# Altium integrated library Samtec 2,54 mm Pitch Socket Strips.IntLib: 489 symbols (part 3 of 4) (continued)
## SSQ-126-22-T-D (continued)

## SSW-102-02-F-S
designator J?
SQ Post Socket, Through-hole, Vertical, -55 to 125 degC, 2.54 mm Pitch, 2-Pin, Female, RoHS; Manufacturer: Samtec; PartNumber: SSW-102-02-F-S; Pitch: 2.54 mm; DatasheetVersion: F-214; PackageVersion: CA, 6/1987; PackageReference: SSW-102-02-X-S; PackageDescription: Assembly, Socket Strip .016 X .031 Tail; Orientation: Vertical; RoHS: True; Temperature Range: -55 to 125 degC; Mounting Technology: Through-hole; ComponentLink1Description: Manufacturer URL; ComponentLink1URL: http://www.samtec.com; ComponentLink2Description: Datasheet; ComponentLink2URL: http://www.samtec.com/documents/webfiles/pdf/SSW_TH.PDF; ComponentLink3Description: Package Specification; ComponentLink3URL: http://www.samtec.com/documents/webfiles/cpdf/SSW-1XX-XX-XXX-X-XX-XXX-XX-MKT.pdf
footprint SMTC-SSW-102-02-X-S (SQ Post Socket, 1x2 Pins, Vertical, 2.54mm Pitch, Female)
pins: 1, 2

## SSW-102-02-F-S-RA
designator J?
SQ Post Socket, Through-hole, Right Angle, -55 to 125 degC, 2.54 mm Pitch, 2-Pin, Female, RoHS; Manufacturer: Samtec; PartNumber: SSW-102-02-F-S-RA; Pitch: 2.54 mm; DatasheetVersion: F-214; PackageVersion: CA, 6/1987; PackageReference: SSW-102-02-X-S-RA; PackageDescription: Assembly, Socket Strip .016 X .031 Tail; Orientation: Right Angle; RoHS: True; Temperature Range: -55 to 125 degC; Mounting Technology: Through-hole; ComponentLink1Description: Manufacturer URL; ComponentLink1URL: http://www.samtec.com; ComponentLink2Description: Datasheet; ComponentLink2URL: http://www.samtec.com/documents/webfiles/pdf/SSW_TH.PDF; ComponentLink3Description: Package Specification; ComponentLink3URL: http://www.samtec.com/documents/webfiles/cpdf/SSW-1XX-XX-XXX-X-XX-XXX-XX-MKT.pdf
footprint SMTC-SSW-102-02-X-S-RA (SQ Post Socket, 1x2 Pins, Right Angle, 2.54mm Pitch, Female)
pins: 1, 2

## SSW-102-02-G-S
designator J?
SQ Post Socket, Through-hole, Vertical, -55 to 125 degC, 2.54 mm Pitch, 2-Pin, Female, RoHS; Manufacturer: Samtec; PartNumber: SSW-102-02-G-S; Pitch: 2.54 mm; DatasheetVersion: F-214; PackageVersion: CA, 6/1987; PackageReference: SSW-102-02-X-S; PackageDescription: Assembly, Socket Strip .016 X .031 Tail; Supplier 1: Digi-Key; Supplier Part Number 1: SAM1216-02-ND; Supplier 2: Farnell; Supplier Part Number 2: 1668334; Supplier 3: Newark; Supplier Part Number 3: 15P2870; Supplier 4: Newark; Supplier Part Number 4: 11P9347; Orientation: Vertical; RoHS: True; Temperature Range: -55 to 125 degC; Mounting Technology: Through-hole; ComponentLink1Description: Manufacturer URL; ComponentLink1URL: http://www.samtec.com; ComponentLink2Description: Datasheet; ComponentLink2URL: http://www.samtec.com/documents/webfiles/pdf/SSW_TH.PDF; ComponentLink3Description: Package Specification; ComponentLink3URL: http://www.samtec.com/documents/webfiles/cpdf/SSW-1XX-XX-XXX-X-XX-XXX-XX-MKT.pdf
footprint SMTC-SSW-102-02-X-S (SQ Post Socket, 1x2 Pins, Vertical, 2.54mm Pitch, Female)
pins: 1, 2

## SSW-102-02-G-S-RA
designator J?
SQ Post Socket, Through-hole, Right Angle, -55 to 125 degC, 2.54 mm Pitch, 2-Pin, Female, RoHS; Manufacturer: Samtec; PartNumber: SSW-102-02-G-S-RA; Pitch: 2.54 mm; DatasheetVersion: F-214; PackageVersion: CA, 6/1987; PackageReference: SSW-102-02-X-S-RA; PackageDescription: Assembly, Socket Strip .016 X .031 Tail; Supplier 1: Digi-Key; Supplier Part Number 1: SAM1225-02-ND; Supplier 2: Farnell; Supplier Part Number 2: 1668335; Supplier 3: Newark; Supplier Part Number 3: 15P2871; Supplier 4: Newark; Supplier Part Number 4: 11P9348; Orientation: Right Angle; RoHS: True; Temperature Range: -55 to 125 degC; Mounting Technology: Through-hole; ComponentLink1Description: Manufacturer URL; ComponentLink1URL: http://www.samtec.com; ComponentLink2Description: Datasheet; ComponentLink2URL: http://www.samtec.com/documents/webfiles/pdf/SSW_TH.PDF; ComponentLink3Description: Package Specification; ComponentLink3URL: http://www.samtec.com/documents/webfiles/cpdf/SSW-1XX-XX-XXX-X-XX-XXX-XX-MKT.pdf
footprint SMTC-SSW-102-02-X-S-RA (SQ Post Socket, 1x2 Pins, Right Angle, 2.54mm Pitch, Female)
pins: 1, 2

## SSW-102-02-L-S
designator J?
SQ Post Socket, Through-hole, Vertical, -55 to 125 degC, 2.54 mm Pitch, 2-Pin, Female, RoHS; Manufacturer: Samtec; PartNumber: SSW-102-02-L-S; Pitch: 2.54 mm; DatasheetVersion: F-214; PackageVersion: CA, 6/1987; PackageReference: SSW-102-02-X-S; PackageDescription: Assembly, Socket Strip .016 X .031 Tail; Orientation: Vertical; RoHS: True; Temperature Range: -55 to 125 degC; Mounting Technology: Through-hole; ComponentLink1Description: Manufacturer URL; ComponentLink1URL: http://www.samtec.com; ComponentLink2Description: Datasheet; ComponentLink2URL: http://www.samtec.com/documents/webfiles/pdf/SSW_TH.PDF; ComponentLink3Description: Package Specification; ComponentLink3URL: http://www.samtec.com/documents/webfiles/cpdf/SSW-1XX-XX-XXX-X-XX-XXX-XX-MKT.pdf
footprint SMTC-SSW-102-02-X-S (SQ Post Socket, 1x2 Pins, Vertical, 2.54mm Pitch, Female)
pins: 1, 2

## SSW-102-02-L-S-RA
designator J?
SQ Post Socket, Through-hole, Right Angle, -55 to 125 degC, 2.54 mm Pitch, 2-Pin, Female, RoHS; Manufacturer: Samtec; PartNumber: SSW-102-02-L-S-RA; Pitch: 2.54 mm; DatasheetVersion: F-214; PackageVersion: CA, 6/1987; PackageReference: SSW-102-02-X-S-RA; PackageDescription: Assembly, Socket Strip .016 X .031 Tail; Orientation: Right Angle; RoHS: True; Temperature Range: -55 to 125 degC; Mounting Technology: Through-hole; ComponentLink1Description: Manufacturer URL; ComponentLink1URL: http://www.samtec.com; ComponentLink2Description: Datasheet; ComponentLink2URL: http://www.samtec.com/documents/webfiles/pdf/SSW_TH.PDF; ComponentLink3Description: Package Specification; ComponentLink3URL: http://www.samtec.com/documents/webfiles/cpdf/SSW-1XX-XX-XXX-X-XX-XXX-XX-MKT.pdf
footprint SMTC-SSW-102-02-X-S-RA (SQ Post Socket, 1x2 Pins, Right Angle, 2.54mm Pitch, Female)
pins: 1, 2

## SSW-102-02-T-S
designator J?
SQ Post Socket, Through-hole, Vertical, -55 to 105 degC, 2.54 mm Pitch, 2-Pin, Female, RoHS; Manufacturer: Samtec; PartNumber: SSW-102-02-T-S; Pitch: 2.54 mm; DatasheetVersion: F-214; PackageVersion: CA, 6/1987; PackageReference: SSW-102-02-X-S; PackageDescription: Assembly, Socket Strip .016 X .031 Tail; Supplier 1: Digi-Key; Supplier Part Number 1: SAM1222-02-ND; Orientation: Vertical; RoHS: True; Temperature Range: -55 to 105 degC; Mounting Technology: Through-hole; ComponentLink1Description: Manufacturer URL; ComponentLink1URL: http://www.samtec.com; ComponentLink2Description: Datasheet; ComponentLink2URL: http://www.samtec.com/documents/webfiles/pdf/SSW_TH.PDF; ComponentLink3Description: Package Specification; ComponentLink3URL: http://www.samtec.com/documents/webfiles/cpdf/SSW-1XX-XX-XXX-X-XX-XXX-XX-MKT.pdf
footprint SMTC-SSW-102-02-X-S (SQ Post Socket, 1x2 Pins, Vertical, 2.54mm Pitch, Female)
pins: 1, 2

## SSW-102-02-T-S-RA
designator J?
SQ Post Socket, Through-hole, Right Angle, -55 to 105 degC, 2.54 mm Pitch, 2-Pin, Female, RoHS; Manufacturer: Samtec; PartNumber: SSW-102-02-T-S-RA; Pitch: 2.54 mm; DatasheetVersion: F-214; PackageVersion: CA, 6/1987; PackageReference: SSW-102-02-X-S-RA; PackageDescription: Assembly, Socket Strip .016 X .031 Tail; Supplier 1: Newark; Supplier Part Number 1: 82P1723; Orientation: Right Angle; RoHS: True; Temperature Range: -55 to 105 degC; Mounting Technology: Through-hole; ComponentLink1Description: Manufacturer URL; ComponentLink1URL: http://www.samtec.com; ComponentLink2Description: Datasheet; ComponentLink2URL: http://www.samtec.com/documents/webfiles/pdf/SSW_TH.PDF; ComponentLink3Description: Package Specification; ComponentLink3URL: http://www.samtec.com/documents/webfiles/cpdf/SSW-1XX-XX-XXX-X-XX-XXX-XX-MKT.pdf
footprint SMTC-SSW-102-02-X-S-RA (SQ Post Socket, 1x2 Pins, Right Angle, 2.54mm Pitch, Female)
pins: 1, 2

## SSW-103-01-F-D
designator J?
SQ Post Socket, Through-hole, Vertical, -55 to 125 degC, 2.54 mm Pitch, 6-Pin, Female, RoHS; Manufacturer: Samtec; PartNumber: SSW-103-01-F-D; Pitch: 2.54 mm; DatasheetVersion: F-214; PackageVersion: CA, 6/1987; PackageReference: SSW-103-01-X-D; PackageDescription: Assembly, Socket Strip .016 X .031 Tail; Supplier 1: Newark; Supplier Part Number 1: 82P1975; Orientation: Vertical; RoHS: True; Temperature Range: -55 to 125 degC; Mounting Technology: Through-hole; ComponentLink1Description: Manufacturer URL; ComponentLink1URL: http://www.samtec.com; ComponentLink2Description: Datasheet; ComponentLink2URL: http://www.samtec.com/documents/webfiles/pdf/SSW_TH.PDF; ComponentLink3Description: Package Specification; ComponentLink3URL: http://www.samtec.com/documents/webfiles/cpdf/SSW-1XX-XX-XXX-X-XX-XXX-XX-MKT.pdf
footprint SMTC-SSW-103-01-X-D (SQ Post Socket, 2x3 Pins, Vertical, 2.54mm Pitch, Female)
pins: 1, 2, 3, 4, 5, 6

## SSW-103-01-G-D
designator J?
SQ Post Socket, Through-hole, Vertical, -55 to 125 degC, 2.54 mm Pitch, 6-Pin, Female, RoHS; Manufacturer: Samtec; PartNumber: SSW-103-01-G-D; Pitch: 2.54 mm; DatasheetVersion: F-214; PackageVersion: CA, 6/1987; PackageReference: SSW-103-01-X-D; PackageDescription: Assembly, Socket Strip .016 X .031 Tail; Supplier 1: Digi-Key; Supplier Part Number 1: SAM1208-03-ND; Supplier 2: Farnell; Supplier Part Number 2: 1668336; Supplier 3: Newark; Supplier Part Number 3: 15P2872; Supplier 4: Newark; Supplier Part Number 4: 11P9356; Orientation: Vertical; RoHS: True; Temperature Range: -55 to 125 degC; Mounting Technology: Through-hole; ComponentLink1Description: Manufacturer URL; ComponentLink1URL: http://www.samtec.com; ComponentLink2Description: Datasheet; ComponentLink2URL: http://www.samtec.com/documents/webfiles/pdf/SSW_TH.PDF; ComponentLink3Description: Package Specification; ComponentLink3URL: http://www.samtec.com/documents/webfiles/cpdf/SSW-1XX-XX-XXX-X-XX-XXX-XX-MKT.pdf
footprint SMTC-SSW-103-01-X-D (SQ Post Socket, 2x3 Pins, Vertical, 2.54mm Pitch, Female)
pins: 1, 2, 3, 4, 5, 6

## SSW-103-01-L-D
designator J?
SQ Post Socket, Through-hole, Vertical, -55 to 125 degC, 2.54 mm Pitch, 6-Pin, Female, RoHS; Manufacturer: Samtec; PartNumber: SSW-103-01-L-D; Pitch: 2.54 mm; DatasheetVersion: F-214; PackageVersion: CA, 6/1987; PackageReference: SSW-103-01-X-D; PackageDescription: Assembly, Socket Strip .016 X .031 Tail; Supplier 1: Newark; Supplier Part Number 1: 87T7165; Orientation: Vertical; RoHS: True; Temperature Range: -55 to 125 degC; Mounting Technology: Through-hole; ComponentLink1Description: Manufacturer URL; ComponentLink1URL: http://www.samtec.com; ComponentLink2Description: Datasheet; ComponentLink2URL: http://www.samtec.com/documents/webfiles/pdf/SSW_TH.PDF; ComponentLink3Description: Package Specification; ComponentLink3URL: http://www.samtec.com/documents/webfiles/cpdf/SSW-1XX-XX-XXX-X-XX-XXX-XX-MKT.pdf
footprint SMTC-SSW-103-01-X-D (SQ Post Socket, 2x3 Pins, Vertical, 2.54mm Pitch, Female)
pins: 1, 2, 3, 4, 5, 6

## SSW-103-01-T-D
designator J?
SQ Post Socket, Through-hole, Vertical, -55 to 105 degC, 2.54 mm Pitch, 6-Pin, Female, RoHS; Manufacturer: Samtec; PartNumber: SSW-103-01-T-D; Pitch: 2.54 mm; DatasheetVersion: F-214; PackageVersion: CA, 6/1987; PackageReference: SSW-103-01-X-D; PackageDescription: Assembly, Socket Strip .016 X .031 Tail; Supplier 1: Digi-Key; Supplier Part Number 1: SAM1212-03-ND; Supplier 2: Newark; Supplier Part Number 2: 11P9359; Orientation: Vertical; RoHS: True; Temperature Range: -55 to 105 degC; Mounting Technology: Through-hole; ComponentLink1Description: Manufacturer URL; ComponentLink1URL: http://www.samtec.com; ComponentLink2Description: Datasheet; ComponentLink2URL: http://www.samtec.com/documents/webfiles/pdf/SSW_TH.PDF; ComponentLink3Description: Package Specification; ComponentLink3URL: http://www.samtec.com/documents/webfiles/cpdf/SSW-1XX-XX-XXX-X-XX-XXX-XX-MKT.pdf
footprint SMTC-SSW-103-01-X-D (SQ Post Socket, 2x3 Pins, Vertical, 2.54mm Pitch, Female)
pins: 1, 2, 3, 4, 5, 6

## SSW-103-22-F-S-VS
designator J?
SQ Post Socket, Surface Mount, Vertical, -55 to 125 degC, 2.54 mm Pitch, 3-Pin, Female, RoHS; Manufacturer: Samtec; PartNumber: SSW-103-22-F-S-VS; Pitch: 2.54 mm; DatasheetVersion: F-214; PackageVersion: AS, 1/1997; PackageReference: SSW-103-22-X-S-VS; PackageDescription: .100 [2.54] Surface Mount Assembly; Supplier 1: Newark; Supplier Part Number 1: 82P2254; Orientation: Vertical; RoHS: True; Temperature Range: -55 to 125 degC; Mounting Technology: Surface Mount; ComponentLink1Description: Manufacturer URL; ComponentLink1URL: http://www.samtec.com; ComponentLink2Description: Datasheet; ComponentLink2URL: http://www.samtec.com/documents/webfiles/pdf/SSW_SM.PDF; ComponentLink3Description: Package Specification; ComponentLink3URL: http://www.samtec.com/documents/webfiles/cpdf/SSW-1XX-22-XXX-X-XX-XX-X-XX-MKT.pdf
footprint SMTC-SSW-103-22-X-S-VS (SQ Post Socket, 3 Pins, Vertical, 2.54mm Pitch, Female)
pins: 1, 2, 3

## SSW-103-22-G-S-VS
designator J?
SQ Post Socket, Surface Mount, Vertical, -55 to 125 degC, 2.54 mm Pitch, 3-Pin, Female, RoHS; Manufacturer: Samtec; PartNumber: SSW-103-22-G-S-VS; Pitch: 2.54 mm; DatasheetVersion: F-214; PackageVersion: AS, 1/1997; PackageReference: SSW-103-22-X-S-VS; PackageDescription: .100 [2.54] Surface Mount Assembly; Orientation: Vertical; RoHS: True; Temperature Range: -55 to 125 degC; Mounting Technology: Surface Mount; ComponentLink1Description: Manufacturer URL; ComponentLink1URL: http://www.samtec.com; ComponentLink2Description: Datasheet; ComponentLink2URL: http://www.samtec.com/documents/webfiles/pdf/SSW_SM.PDF; ComponentLink3Description: Package Specification; ComponentLink3URL: http://www.samtec.com/documents/webfiles/cpdf/SSW-1XX-22-XXX-X-XX-XX-X-XX-MKT.pdf
footprint SMTC-SSW-103-22-X-S-VS (SQ Post Socket, 3 Pins, Vertical, 2.54mm Pitch, Female)
pins: 1, 2, 3

## SSW-103-22-L-S-VS
designator J?
SQ Post Socket, Surface Mount, Vertical, -55 to 125 degC, 2.54 mm Pitch, 3-Pin, Female, RoHS; Manufacturer: Samtec; PartNumber: SSW-103-22-L-S-VS; Pitch: 2.54 mm; DatasheetVersion: F-214; PackageVersion: AS, 1/1997; PackageReference: SSW-103-22-X-S-VS; PackageDescription: .100 [2.54] Surface Mount Assembly; Orientation: Vertical; RoHS: True; Temperature Range: -55 to 125 degC; Mounting Technology: Surface Mount; ComponentLink1Description: Manufacturer URL; ComponentLink1URL: http://www.samtec.com; ComponentLink2Description: Datasheet; ComponentLink2URL: http://www.samtec.com/documents/webfiles/pdf/SSW_SM.PDF; ComponentLink3Description: Package Specification; ComponentLink3URL: http://www.samtec.com/documents/webfiles/cpdf/SSW-1XX-22-XXX-X-XX-XX-X-XX-MKT.pdf
footprint SMTC-SSW-103-22-X-S-VS (SQ Post Socket, 3 Pins, Vertical, 2.54mm Pitch, Female)
pins: 1, 2, 3

## SSW-104-01-F-D
designator J?
SQ Post Socket, Through-hole, Vertical, -55 to 125 degC, 2.54mm Pitch, 8-Pin, Female, RoHS; Manufacturer: Samtec; PartNumber: SSW-104-01-F-D; DatasheetVersion: F-214; PackageVersion: CA, 6/1987; PackageReference: SSW-104-01-X-D; PackageDescription: Assembly, Socket Strip .016 X .031 Tail; Orientation: Vertical; Pitch: 2.54 mm; RoHS: True; Temperature Range: -55 to 125 degC; Mounting Technology: Through-hole; ComponentLink1Description: Manufacturer URL; ComponentLink1URL: http://www.samtec.com; ComponentLink2Description: Datasheet; ComponentLink2URL: http://www.samtec.com/documents/webfiles/pdf/SSW_TH.PDF; ComponentLink3Description: Package Specification; ComponentLink3URL: http://www.samtec.com/documents/webfiles/cpdf/SSW-1XX-XX-XXX-X-XX-XXX-XX-MKT.pdf
footprint SMTC-SSW-104-01-X-D (SQ Post Socket, 2x4 Pins, Vertical, 2.54mm Pitch, Female)
pins: 1, 2, 3, 4, 5, 6, 7, 8

## SSW-104-01-G-D
designator J?
SQ Post Socket, Through-hole, Vertical, -55 to 125 degC, 2.54mm Pitch, 8-Pin, Female, RoHS; Manufacturer: Samtec; PartNumber: SSW-104-01-G-D; DatasheetVersion: F-214; PackageVersion: CA, 6/1987; PackageReference: SSW-104-01-X-D; PackageDescription: Assembly, Socket Strip .016 X .031 Tail; Supplier 1: Digi-Key; Supplier Part Number 1: SAM1208-04-ND; Supplier 2: Farnell; Supplier Part Number 2: 1668340; Supplier 3: Newark; Supplier Part Number 3: 11P9372; Orientation: Vertical; Pitch: 2.54 mm; RoHS: True; Temperature Range: -55 to 125 degC; Mounting Technology: Through-hole; ComponentLink1Description: Manufacturer URL; ComponentLink1URL: http://www.samtec.com; ComponentLink2Description: Datasheet; ComponentLink2URL: http://www.samtec.com/documents/webfiles/pdf/SSW_TH.PDF; ComponentLink3Description: Package Specification; ComponentLink3URL: http://www.samtec.com/documents/webfiles/cpdf/SSW-1XX-XX-XXX-X-XX-XXX-XX-MKT.pdf
footprint SMTC-SSW-104-01-X-D (SQ Post Socket, 2x4 Pins, Vertical, 2.54mm Pitch, Female)
pins: 1, 2, 3, 4, 5, 6, 7, 8

## SSW-104-01-L-D
designator J?
SQ Post Socket, Through-hole, Vertical, -55 to 125 degC, 2.54mm Pitch, 8-Pin, Female, RoHS; Manufacturer: Samtec; PartNumber: SSW-104-01-L-D; DatasheetVersion: F-214; PackageVersion: CA, 6/1987; PackageReference: SSW-104-01-X-D; PackageDescription: Assembly, Socket Strip .016 X .031 Tail; Orientation: Vertical; Pitch: 2.54 mm; RoHS: True; Temperature Range: -55 to 125 degC; Mounting Technology: Through-hole; ComponentLink1Description: Manufacturer URL; ComponentLink1URL: http://www.samtec.com; ComponentLink2Description: Datasheet; ComponentLink2URL: http://www.samtec.com/documents/webfiles/pdf/SSW_TH.PDF; ComponentLink3Description: Package Specification; ComponentLink3URL: http://www.samtec.com/documents/webfiles/cpdf/SSW-1XX-XX-XXX-X-XX-XXX-XX-MKT.pdf
footprint SMTC-SSW-104-01-X-D (SQ Post Socket, 2x4 Pins, Vertical, 2.54mm Pitch, Female)
pins: 1, 2, 3, 4, 5, 6, 7, 8

## SSW-104-01-T-D
designator J?
SQ Post Socket, Through-hole, Vertical, -55 to 105 degC, 2.54mm Pitch, 8-Pin, Female, RoHS; Manufacturer: Samtec; PartNumber: SSW-104-01-T-D; DatasheetVersion: F-214; PackageVersion: CA, 6/1987; PackageReference: SSW-104-01-X-D; PackageDescription: Assembly, Socket Strip .016 X .031 Tail; Supplier 1: Digi-Key; Supplier Part Number 1: SAM1212-04-ND; Supplier 2: Newark; Supplier Part Number 2: 11P9376; Orientation: Vertical; Pitch: 2.54 mm; RoHS: True; Temperature Range: -55 to 105 degC; Mounting Technology: Through-hole; ComponentLink1Description: Manufacturer URL; ComponentLink1URL: http://www.samtec.com; ComponentLink2Description: Datasheet; ComponentLink2URL: http://www.samtec.com/documents/webfiles/pdf/SSW_TH.PDF; ComponentLink3Description: Package Specification; ComponentLink3URL: http://www.samtec.com/documents/webfiles/cpdf/SSW-1XX-XX-XXX-X-XX-XXX-XX-MKT.pdf
footprint SMTC-SSW-104-01-X-D (SQ Post Socket, 2x4 Pins, Vertical, 2.54mm Pitch, Female)
pins: 1, 2, 3, 4, 5, 6, 7, 8

## SSW-104-02-F-D
designator J?
SQ Post Socket, Through-hole, Vertical, -55 to 125 degC, 2.54mm Pitch, 8-Pin, Female, RoHS; Manufacturer: Samtec; PartNumber: SSW-104-02-F-D; DatasheetVersion: F-214; PackageVersion: CA, 6/1987; PackageReference: SSW-104-02-X-D; PackageDescription: Assembly, Socket Strip .016 X .031 Tail; Orientation: Vertical; Pitch: 2.54 mm; RoHS: True; Temperature Range: -55 to 125 degC; Mounting Technology: Through-hole; ComponentLink1Description: Manufacturer URL; ComponentLink1URL: http://www.samtec.com; ComponentLink2Description: Datasheet; ComponentLink2URL: http://www.samtec.com/documents/webfiles/pdf/SSW_TH.PDF; ComponentLink3Description: Package Specification; ComponentLink3URL: http://www.samtec.com/documents/webfiles/cpdf/SSW-1XX-XX-XXX-X-XX-XXX-XX-MKT.pdf
footprint SMTC-SSW-104-02-X-D (SQ Post Socket, 2x4 Pins, Vertical, 2.54mm Pitch, Female)
pins: 1, 2, 3, 4, 5, 6, 7, 8

## SSW-104-02-G-D
designator J?
SQ Post Socket, Through-hole, Vertical, -55 to 125 degC, 2.54mm Pitch, 8-Pin, Female, RoHS; Manufacturer: Samtec; PartNumber: SSW-104-02-G-D; DatasheetVersion: F-214; PackageVersion: CA, 6/1987; PackageReference: SSW-104-02-X-D; PackageDescription: Assembly, Socket Strip .016 X .031 Tail; Supplier 1: Digi-Key; Supplier Part Number 1: SAM1214-04-ND; Orientation: Vertical; Pitch: 2.54 mm; RoHS: True; Temperature Range: -55 to 125 degC; Mounting Technology: Through-hole; ComponentLink1Description: Manufacturer URL; ComponentLink1URL: http://www.samtec.com; ComponentLink2Description: Datasheet; ComponentLink2URL: http://www.samtec.com/documents/webfiles/pdf/SSW_TH.PDF; ComponentLink3Description: Package Specification; ComponentLink3URL: http://www.samtec.com/documents/webfiles/cpdf/SSW-1XX-XX-XXX-X-XX-XXX-XX-MKT.pdf
footprint SMTC-SSW-104-02-X-D (SQ Post Socket, 2x4 Pins, Vertical, 2.54mm Pitch, Female)
pins: 1, 2, 3, 4, 5, 6, 7, 8

## SSW-104-02-L-D
designator J?
SQ Post Socket, Through-hole, Vertical, -55 to 125 degC, 2.54mm Pitch, 8-Pin, Female, RoHS; Manufacturer: Samtec; PartNumber: SSW-104-02-L-D; DatasheetVersion: F-214; PackageVersion: CA, 6/1987; PackageReference: SSW-104-02-X-D; PackageDescription: Assembly, Socket Strip .016 X .031 Tail; Orientation: Vertical; Pitch: 2.54 mm; RoHS: True; Temperature Range: -55 to 125 degC; Mounting Technology: Through-hole; ComponentLink1Description: Manufacturer URL; ComponentLink1URL: http://www.samtec.com; ComponentLink2Description: Datasheet; ComponentLink2URL: http://www.samtec.com/documents/webfiles/pdf/SSW_TH.PDF; ComponentLink3Description: Package Specification; ComponentLink3URL: http://www.samtec.com/documents/webfiles/cpdf/SSW-1XX-XX-XXX-X-XX-XXX-XX-MKT.pdf
footprint SMTC-SSW-104-02-X-D (SQ Post Socket, 2x4 Pins, Vertical, 2.54mm Pitch, Female)
pins: 1, 2, 3, 4, 5, 6, 7, 8

## SSW-104-02-T-D
designator J?
SQ Post Socket, Through-hole, Vertical, -55 to 105 degC, 2.54mm Pitch, 8-Pin, Female, RoHS; Manufacturer: Samtec; PartNumber: SSW-104-02-T-D; DatasheetVersion: F-214; PackageVersion: CA, 6/1987; PackageReference: SSW-104-02-X-D; PackageDescription: Assembly, Socket Strip .016 X .031 Tail; Supplier 1: Digi-Key; Supplier Part Number 1: SAM1221-04-ND; Orientation: Vertical; Pitch: 2.54 mm; RoHS: True; Temperature Range: -55 to 105 degC; Mounting Technology: Through-hole; ComponentLink1Description: Manufacturer URL; ComponentLink1URL: http://www.samtec.com; ComponentLink2Description: Datasheet; ComponentLink2URL: http://www.samtec.com/documents/webfiles/pdf/SSW_TH.PDF; ComponentLink3Description: Package Specification; ComponentLink3URL: http://www.samtec.com/documents/webfiles/cpdf/SSW-1XX-XX-XXX-X-XX-XXX-XX-MKT.pdf
footprint SMTC-SSW-104-02-X-D (SQ Post Socket, 2x4 Pins, Vertical, 2.54mm Pitch, Female)
pins: 1, 2, 3, 4, 5, 6, 7, 8

## SSW-105-01-F-S
designator J?
SQ Post Socket, Through-hole, Vertical, -55 to 125 degC, 2.54mm Pitch, 5-Pin, Female, RoHS; Manufacturer: Samtec; PartNumber: SSW-105-01-F-S; DatasheetVersion: F-214; PackageVersion: CA, 6/1987; PackageReference: SSW-105-01-X-S; PackageDescription: Assembly, Socket Strip .016 X .031 Tail; Orientation: Vertical; Pitch: 2.54 mm; RoHS: True; Temperature Range: -55 to 125 degC; Mounting Technology: Through-hole; ComponentLink1Description: Manufacturer URL; ComponentLink1URL: http://www.samtec.com; ComponentLink2Description: Datasheet; ComponentLink2URL: http://www.samtec.com/documents/webfiles/pdf/SSW_TH.PDF; ComponentLink3Description: Package Specification; ComponentLink3URL: http://www.samtec.com/documents/webfiles/cpdf/SSW-1XX-XX-XXX-X-XX-XXX-XX-MKT.pdf
footprint SMTC-SSW-105-01-X-S (SQ Post Socket, 1x5 Pins, Vertical, 2.54mm Pitch, Female)
pins: 1, 2, 3, 4, 5

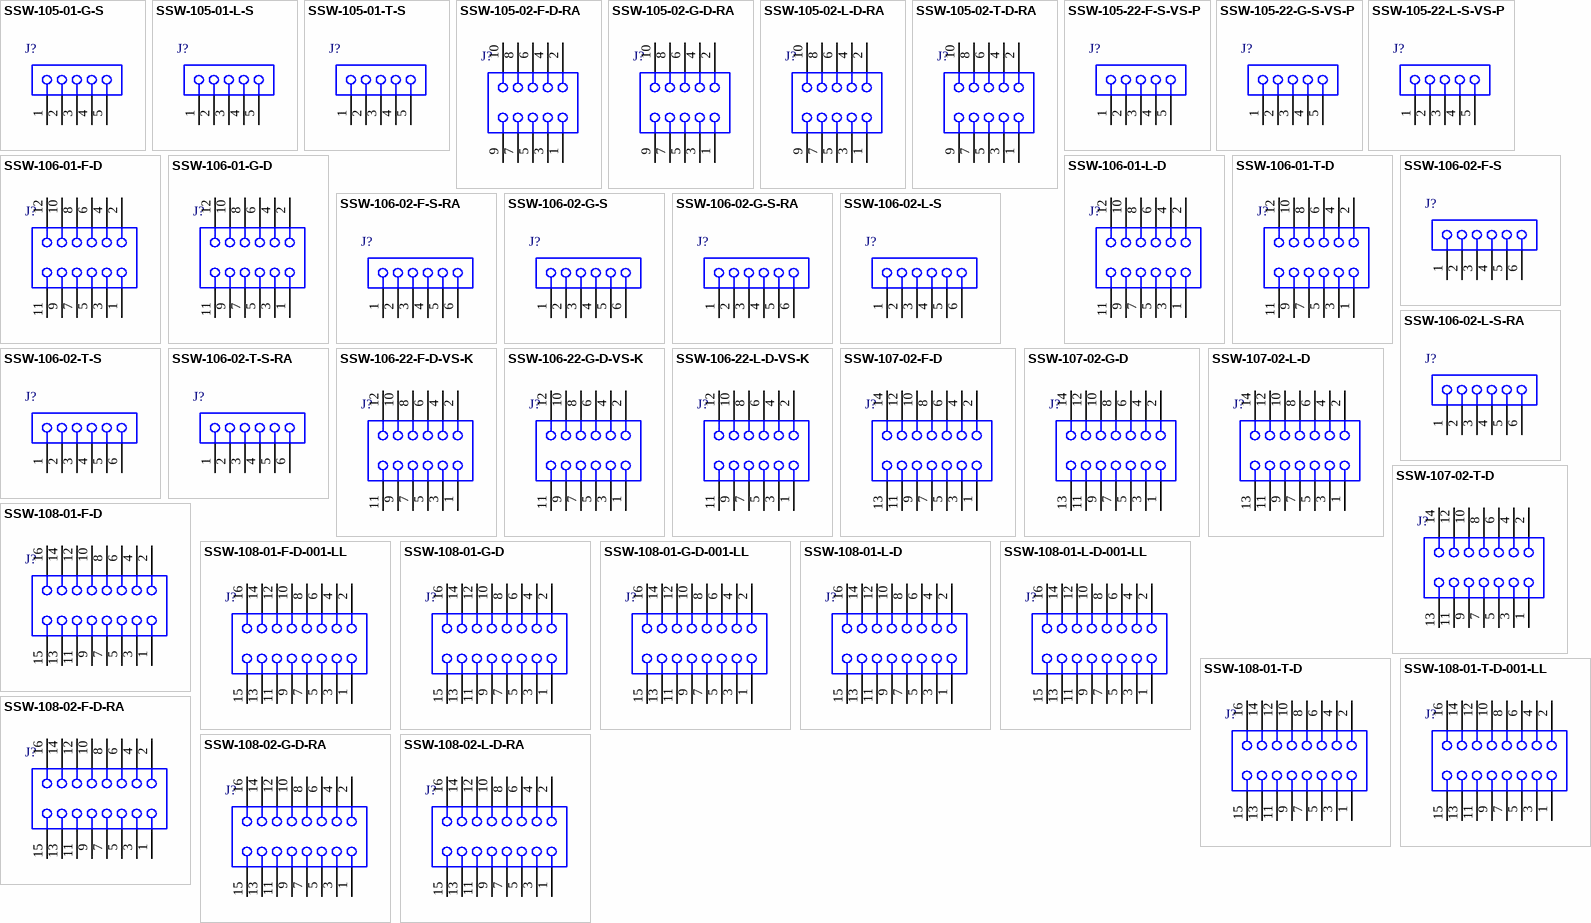
[diagram p9: symbols SSW-105-01-G-S to SSW-108-02-L-D-RA]

## SSW-105-01-G-S
designator J?
SQ Post Socket, Through-hole, Vertical, -55 to 125 degC, 2.54mm Pitch, 5-Pin, Female, RoHS; Manufacturer: Samtec; PartNumber: SSW-105-01-G-S; DatasheetVersion: F-214; PackageVersion: CA, 6/1987; PackageReference: SSW-105-01-X-S; PackageDescription: Assembly, Socket Strip .016 X .031 Tail; Supplier 1: Digi-Key; Supplier Part Number 1: SAM1209-05-ND; Supplier 2: Newark; Supplier Part Number 2: 11P9390; Orientation: Vertical; Pitch: 2.54 mm; RoHS: True; Temperature Range: -55 to 125 degC; Mounting Technology: Through-hole; ComponentLink1Description: Manufacturer URL; ComponentLink1URL: http://www.samtec.com; ComponentLink2Description: Datasheet; ComponentLink2URL: http://www.samtec.com/documents/webfiles/pdf/SSW_TH.PDF; ComponentLink3Description: Package Specification; ComponentLink3URL: http://www.samtec.com/documents/webfiles/cpdf/SSW-1XX-XX-XXX-X-XX-XXX-XX-MKT.pdf
footprint SMTC-SSW-105-01-X-S (SQ Post Socket, 1x5 Pins, Vertical, 2.54mm Pitch, Female)
pins: 1, 2, 3, 4, 5

## SSW-105-01-L-S
designator J?
SQ Post Socket, Through-hole, Vertical, -55 to 125 degC, 2.54mm Pitch, 5-Pin, Female, RoHS; Manufacturer: Samtec; PartNumber: SSW-105-01-L-S; DatasheetVersion: F-214; PackageVersion: CA, 6/1987; PackageReference: SSW-105-01-X-S; PackageDescription: Assembly, Socket Strip .016 X .031 Tail; Orientation: Vertical; Pitch: 2.54 mm; RoHS: True; Temperature Range: -55 to 125 degC; Mounting Technology: Through-hole; ComponentLink1Description: Manufacturer URL; ComponentLink1URL: http://www.samtec.com; ComponentLink2Description: Datasheet; ComponentLink2URL: http://www.samtec.com/documents/webfiles/pdf/SSW_TH.PDF; ComponentLink3Description: Package Specification; ComponentLink3URL: http://www.samtec.com/documents/webfiles/cpdf/SSW-1XX-XX-XXX-X-XX-XXX-XX-MKT.pdf
footprint SMTC-SSW-105-01-X-S (SQ Post Socket, 1x5 Pins, Vertical, 2.54mm Pitch, Female)
pins: 1, 2, 3, 4, 5

## SSW-105-01-T-S
designator J?
SQ Post Socket, Through-hole, Vertical, -55 to 105 degC, 2.54mm Pitch, 5-Pin, Female, RoHS; Manufacturer: Samtec; PartNumber: SSW-105-01-T-S; DatasheetVersion: F-214; PackageVersion: CA, 6/1987; PackageReference: SSW-105-01-X-S; PackageDescription: Assembly, Socket Strip .016 X .031 Tail; Supplier 1: Digi-Key; Supplier Part Number 1: SAM1213-05-ND; Supplier 2: Newark; Supplier Part Number 2: 11P9393; Orientation: Vertical; Pitch: 2.54 mm; RoHS: True; Temperature Range: -55 to 105 degC; Mounting Technology: Through-hole; ComponentLink1Description: Manufacturer URL; ComponentLink1URL: http://www.samtec.com; ComponentLink2Description: Datasheet; ComponentLink2URL: http://www.samtec.com/documents/webfiles/pdf/SSW_TH.PDF; ComponentLink3Description: Package Specification; ComponentLink3URL: http://www.samtec.com/documents/webfiles/cpdf/SSW-1XX-XX-XXX-X-XX-XXX-XX-MKT.pdf
footprint SMTC-SSW-105-01-X-S (SQ Post Socket, 1x5 Pins, Vertical, 2.54mm Pitch, Female)
pins: 1, 2, 3, 4, 5

## SSW-105-02-F-D-RA
designator J?
SQ Post Socket, Through-hole, Right Angle, -55 to 125 degC, 2.54mm Pitch, 10-Pin, Female, RoHS; Manufacturer: Samtec; PartNumber: SSW-105-02-F-D-RA; DatasheetVersion: F-214; PackageVersion: CA, 6/1987; PackageReference: SSW-105-02-X-D-RA; PackageDescription: Assembly, Socket Strip .016 X .031 Tail; Orientation: Right Angle; Pitch: 2.54 mm; RoHS: True; Temperature Range: -55 to 125 degC; Mounting Technology: Through-hole; ComponentLink1Description: Manufacturer URL; ComponentLink1URL: http://www.samtec.com; ComponentLink2Description: Datasheet; ComponentLink2URL: http://www.samtec.com/documents/webfiles/pdf/SSW_TH.PDF; ComponentLink3Description: Package Specification; ComponentLink3URL: http://www.samtec.com/documents/webfiles/cpdf/SSW-1XX-XX-XXX-X-XX-XXX-XX-MKT.pdf
footprint SMTC-SSW-105-02-X-D-RA (SQ Post Socket, 2x5 Pins, Right Angle, 2.54mm Pitch, Female)
pins: 1, 2, 3, 4, 5, 6, 7, 8, 9, 10

## SSW-105-02-G-D-RA
designator J?
SQ Post Socket, Through-hole, Right Angle, -55 to 125 degC, 2.54mm Pitch, 10-Pin, Female, RoHS; Manufacturer: Samtec; PartNumber: SSW-105-02-G-D-RA; DatasheetVersion: F-214; PackageVersion: CA, 6/1987; PackageReference: SSW-105-02-X-D-RA; PackageDescription: Assembly, Socket Strip .016 X .031 Tail; Supplier 1: Digi-Key; Supplier Part Number 1: SAM1215-05-ND; Supplier 2: Farnell; Supplier Part Number 2: 1668349; Supplier 3: Newark; Supplier Part Number 3: 15P2884; Supplier 4: Newark; Supplier Part Number 4: 11P9395; Orientation: Right Angle; Pitch: 2.54 mm; RoHS: True; Temperature Range: -55 to 125 degC; Mounting Technology: Through-hole; ComponentLink1Description: Manufacturer URL; ComponentLink1URL: http://www.samtec.com; ComponentLink2Description: Datasheet; ComponentLink2URL: http://www.samtec.com/documents/webfiles/pdf/SSW_TH.PDF; ComponentLink3Description: Package Specification; ComponentLink3URL: http://www.samtec.com/documents/webfiles/cpdf/SSW-1XX-XX-XXX-X-XX-XXX-XX-MKT.pdf
footprint SMTC-SSW-105-02-X-D-RA (SQ Post Socket, 2x5 Pins, Right Angle, 2.54mm Pitch, Female)
pins: 1, 2, 3, 4, 5, 6, 7, 8, 9, 10

## SSW-105-02-L-D-RA
designator J?
SQ Post Socket, Through-hole, Right Angle, -55 to 125 degC, 2.54mm Pitch, 10-Pin, Female, RoHS; Manufacturer: Samtec; PartNumber: SSW-105-02-L-D-RA; DatasheetVersion: F-214; PackageVersion: CA, 6/1987; PackageReference: SSW-105-02-X-D-RA; PackageDescription: Assembly, Socket Strip .016 X .031 Tail; Orientation: Right Angle; Pitch: 2.54 mm; RoHS: True; Temperature Range: -55 to 125 degC; Mounting Technology: Through-hole; ComponentLink1Description: Manufacturer URL; ComponentLink1URL: http://www.samtec.com; ComponentLink2Description: Datasheet; ComponentLink2URL: http://www.samtec.com/documents/webfiles/pdf/SSW_TH.PDF; ComponentLink3Description: Package Specification; ComponentLink3URL: http://www.samtec.com/documents/webfiles/cpdf/SSW-1XX-XX-XXX-X-XX-XXX-XX-MKT.pdf
footprint SMTC-SSW-105-02-X-D-RA (SQ Post Socket, 2x5 Pins, Right Angle, 2.54mm Pitch, Female)
pins: 1, 2, 3, 4, 5, 6, 7, 8, 9, 10

## SSW-105-02-T-D-RA
designator J?
SQ Post Socket, Through-hole, Right Angle, -55 to 105 degC, 2.54mm Pitch, 10-Pin, Female, RoHS; Manufacturer: Samtec; PartNumber: SSW-105-02-T-D-RA; DatasheetVersion: F-214; PackageVersion: CA, 6/1987; PackageReference: SSW-105-02-X-D-RA; PackageDescription: Assembly, Socket Strip .016 X .031 Tail; Supplier 1: Digi-Key; Supplier Part Number 1: SSW-105-02-T-D-RA-ND; Supplier 2: Farnell; Supplier Part Number 2: 2308470; Supplier 3: Newark; Supplier Part Number 3: 06M4939; Supplier 4: Newark; Supplier Part Number 4: 70W0678; Orientation: Right Angle; Pitch: 2.54 mm; RoHS: True; Temperature Range: -55 to 105 degC; Mounting Technology: Through-hole; ComponentLink1Description: Manufacturer URL; ComponentLink1URL: http://www.samtec.com; ComponentLink2Description: Datasheet; ComponentLink2URL: http://www.samtec.com/documents/webfiles/pdf/SSW_TH.PDF; ComponentLink3Description: Package Specification; ComponentLink3URL: http://www.samtec.com/documents/webfiles/cpdf/SSW-1XX-XX-XXX-X-XX-XXX-XX-MKT.pdf
footprint SMTC-SSW-105-02-X-D-RA (SQ Post Socket, 2x5 Pins, Right Angle, 2.54mm Pitch, Female)
pins: 1, 2, 3, 4, 5, 6, 7, 8, 9, 10

## SSW-105-22-F-S-VS-P
designator J?
SQ Post Socket, Surface Mount, Vertical, -55 to 125 degC, 2.54mm Pitch, 5-Pin, Female, RoHS; Manufacturer: Samtec; PartNumber: SSW-105-22-F-S-VS-P; DatasheetVersion: F-214; PackageVersion: AS, 1/1997; PackageReference: SSW-105-22-X-S-VS-P; PackageDescription: .100 [2.54] Surface Mount Assembly; Orientation: Vertical; Pitch: 2.54 mm; RoHS: True; Temperature Range: -55 to 125 degC; Mounting Technology: Surface Mount; ComponentLink1Description: Manufacturer URL; ComponentLink1URL: http://www.samtec.com; ComponentLink2Description: Datasheet; ComponentLink2URL: http://www.samtec.com/documents/webfiles/pdf/SSW_SM.PDF; ComponentLink3Description: Package Specification; ComponentLink3URL: http://www.samtec.com/documents/webfiles/cpdf/SSW-1XX-22-XXX-X-XX-XX-X-XX-MKT.pdf
footprint SMTC-SSW-105-22-X-S-VS-P (SQ Post Socket, 5 Pins, Vertical, 2.54mm Pitch, Female)
pins: 1, 2, 3, 4, 5

## SSW-105-22-G-S-VS-P
designator J?
SQ Post Socket, Surface Mount, Vertical, -55 to 125 degC, 2.54mm Pitch, 5-Pin, Female, RoHS; Manufacturer: Samtec; PartNumber: SSW-105-22-G-S-VS-P; DatasheetVersion: F-214; PackageVersion: AS, 1/1997; PackageReference: SSW-105-22-X-S-VS-P; PackageDescription: .100 [2.54] Surface Mount Assembly; Orientation: Vertical; Pitch: 2.54 mm; RoHS: True; Temperature Range: -55 to 125 degC; Mounting Technology: Surface Mount; ComponentLink1Description: Manufacturer URL; ComponentLink1URL: http://www.samtec.com; ComponentLink2Description: Datasheet; ComponentLink2URL: http://www.samtec.com/documents/webfiles/pdf/SSW_SM.PDF; ComponentLink3Description: Package Specification; ComponentLink3URL: http://www.samtec.com/documents/webfiles/cpdf/SSW-1XX-22-XXX-X-XX-XX-X-XX-MKT.pdf
footprint SMTC-SSW-105-22-X-S-VS-P (SQ Post Socket, 5 Pins, Vertical, 2.54mm Pitch, Female)
pins: 1, 2, 3, 4, 5

## SSW-105-22-L-S-VS-P
designator J?
SQ Post Socket, Surface Mount, Vertical, -55 to 125 degC, 2.54mm Pitch, 5-Pin, Female, RoHS; Manufacturer: Samtec; PartNumber: SSW-105-22-L-S-VS-P; DatasheetVersion: F-214; PackageVersion: AS, 1/1997; PackageReference: SSW-105-22-X-S-VS-P; PackageDescription: .100 [2.54] Surface Mount Assembly; Orientation: Vertical; Pitch: 2.54 mm; RoHS: True; Temperature Range: -55 to 125 degC; Mounting Technology: Surface Mount; ComponentLink1Description: Manufacturer URL; ComponentLink1URL: http://www.samtec.com; ComponentLink2Description: Datasheet; ComponentLink2URL: http://www.samtec.com/documents/webfiles/pdf/SSW_SM.PDF; ComponentLink3Description: Package Specification; ComponentLink3URL: http://www.samtec.com/documents/webfiles/cpdf/SSW-1XX-22-XXX-X-XX-XX-X-XX-MKT.pdf
footprint SMTC-SSW-105-22-X-S-VS-P (SQ Post Socket, 5 Pins, Vertical, 2.54mm Pitch, Female)
pins: 1, 2, 3, 4, 5

## SSW-106-01-F-D
designator J?
SQ Post Socket, Through-hole, Vertical, -55 to 125 degC, 2.54mm Pitch, 12-Pin, Female, RoHS; Manufacturer: Samtec; PartNumber: SSW-106-01-F-D; DatasheetVersion: F-214; PackageVersion: CA, 6/1987; PackageReference: SSW-106-01-X-D; PackageDescription: Assembly, Socket Strip .016 X .031 Tail; Supplier 1: Newark; Supplier Part Number 1: 48P5436; Orientation: Vertical; Pitch: 2.54 mm; RoHS: True; Temperature Range: -55 to 125 degC; Mounting Technology: Through-hole; ComponentLink1Description: Manufacturer URL; ComponentLink1URL: http://www.samtec.com; ComponentLink2Description: Datasheet; ComponentLink2URL: http://www.samtec.com/documents/webfiles/pdf/SSW_TH.PDF; ComponentLink3Description: Package Specification; ComponentLink3URL: http://www.samtec.com/documents/webfiles/cpdf/SSW-1XX-XX-XXX-X-XX-XXX-XX-MKT.pdf
footprint SMTC-SSW-106-01-X-D (SQ Post Socket, 2x6 Pins, Vertical, 2.54mm Pitch, Female)
pins: 1, 2, 3, 4, 5, 6, 7, 8, 9, 10, 11, 12

## SSW-106-01-G-D
designator J?
SQ Post Socket, Through-hole, Vertical, -55 to 125 degC, 2.54mm Pitch, 12-Pin, Female, RoHS; Manufacturer: Samtec; PartNumber: SSW-106-01-G-D; DatasheetVersion: F-214; PackageVersion: CA, 6/1987; PackageReference: SSW-106-01-X-D; PackageDescription: Assembly, Socket Strip .016 X .031 Tail; Supplier 1: Digi-Key; Supplier Part Number 1: SAM1208-06-ND; Supplier 2: Farnell; Supplier Part Number 2: 1668351; Supplier 3: Newark; Supplier Part Number 3: 11P9404; Orientation: Vertical; Pitch: 2.54 mm; RoHS: True; Temperature Range: -55 to 125 degC; Mounting Technology: Through-hole; ComponentLink1Description: Manufacturer URL; ComponentLink1URL: http://www.samtec.com; ComponentLink2Description: Datasheet; ComponentLink2URL: http://www.samtec.com/documents/webfiles/pdf/SSW_TH.PDF; ComponentLink3Description: Package Specification; ComponentLink3URL: http://www.samtec.com/documents/webfiles/cpdf/SSW-1XX-XX-XXX-X-XX-XXX-XX-MKT.pdf
footprint SMTC-SSW-106-01-X-D (SQ Post Socket, 2x6 Pins, Vertical, 2.54mm Pitch, Female)
pins: 1, 2, 3, 4, 5, 6, 7, 8, 9, 10, 11, 12

## SSW-106-01-L-D
designator J?
SQ Post Socket, Through-hole, Vertical, -55 to 125 degC, 2.54mm Pitch, 12-Pin, Female, RoHS; Manufacturer: Samtec; PartNumber: SSW-106-01-L-D; DatasheetVersion: F-214; PackageVersion: CA, 6/1987; PackageReference: SSW-106-01-X-D; PackageDescription: Assembly, Socket Strip .016 X .031 Tail; Orientation: Vertical; Pitch: 2.54 mm; RoHS: True; Temperature Range: -55 to 125 degC; Mounting Technology: Through-hole; ComponentLink1Description: Manufacturer URL; ComponentLink1URL: http://www.samtec.com; ComponentLink2Description: Datasheet; ComponentLink2URL: http://www.samtec.com/documents/webfiles/pdf/SSW_TH.PDF; ComponentLink3Description: Package Specification; ComponentLink3URL: http://www.samtec.com/documents/webfiles/cpdf/SSW-1XX-XX-XXX-X-XX-XXX-XX-MKT.pdf
footprint SMTC-SSW-106-01-X-D (SQ Post Socket, 2x6 Pins, Vertical, 2.54mm Pitch, Female)
pins: 1, 2, 3, 4, 5, 6, 7, 8, 9, 10, 11, 12

## SSW-106-01-T-D
designator J?
SQ Post Socket, Through-hole, Vertical, -55 to 105 degC, 2.54mm Pitch, 12-Pin, Female, RoHS; Manufacturer: Samtec; PartNumber: SSW-106-01-T-D; DatasheetVersion: F-214; PackageVersion: CA, 6/1987; PackageReference: SSW-106-01-X-D; PackageDescription: Assembly, Socket Strip .016 X .031 Tail; Supplier 1: Digi-Key; Supplier Part Number 1: SAM1212-06-ND; Supplier 2: Newark; Supplier Part Number 2: 11P9408; Orientation: Vertical; Pitch: 2.54 mm; RoHS: True; Temperature Range: -55 to 105 degC; Mounting Technology: Through-hole; ComponentLink1Description: Manufacturer URL; ComponentLink1URL: http://www.samtec.com; ComponentLink2Description: Datasheet; ComponentLink2URL: http://www.samtec.com/documents/webfiles/pdf/SSW_TH.PDF; ComponentLink3Description: Package Specification; ComponentLink3URL: http://www.samtec.com/documents/webfiles/cpdf/SSW-1XX-XX-XXX-X-XX-XXX-XX-MKT.pdf
footprint SMTC-SSW-106-01-X-D (SQ Post Socket, 2x6 Pins, Vertical, 2.54mm Pitch, Female)
pins: 1, 2, 3, 4, 5, 6, 7, 8, 9, 10, 11, 12

## SSW-106-02-F-S
designator J?
SQ Post Socket, Through-hole, Vertical, -55 to 125 degC, 2.54mm Pitch, 6-Pin, Female, RoHS; Manufacturer: Samtec; PartNumber: SSW-106-02-F-S; DatasheetVersion: F-214; PackageVersion: CA, 6/1987; PackageReference: SSW-106-02-X-S; PackageDescription: Assembly, Socket Strip .016 X .031 Tail; Orientation: Vertical; Pitch: 2.54 mm; RoHS: True; Temperature Range: -55 to 125 degC; Mounting Technology: Through-hole; ComponentLink1Description: Manufacturer URL; ComponentLink1URL: http://www.samtec.com; ComponentLink2Description: Datasheet; ComponentLink2URL: http://www.samtec.com/documents/webfiles/pdf/SSW_TH.PDF; ComponentLink3Description: Package Specification; ComponentLink3URL: http://www.samtec.com/documents/webfiles/cpdf/SSW-1XX-XX-XXX-X-XX-XXX-XX-MKT.pdf
footprint SMTC-SSW-106-02-X-S (SQ Post Socket, 1x6 Pins, Vertical, 2.54mm Pitch, Female)
pins: 1, 2, 3, 4, 5, 6

## SSW-106-02-F-S-RA
designator J?
SQ Post Socket, Through-hole, Right Angle, -55 to 125 degC, 2.54mm Pitch, 6-Pin, Female, RoHS; Manufacturer: Samtec; PartNumber: SSW-106-02-F-S-RA; DatasheetVersion: F-214; PackageVersion: CA, 6/1987; PackageReference: SSW-106-02-X-S-RA; PackageDescription: Assembly, Socket Strip .016 X .031 Tail; Supplier 1: Newark; Supplier Part Number 1: 82P3375; Orientation: Right Angle; Pitch: 2.54 mm; RoHS: True; Temperature Range: -55 to 125 degC; Mounting Technology: Through-hole; ComponentLink1Description: Manufacturer URL; ComponentLink1URL: http://www.samtec.com; ComponentLink2Description: Datasheet; ComponentLink2URL: http://www.samtec.com/documents/webfiles/pdf/SSW_TH.PDF; ComponentLink3Description: Package Specification; ComponentLink3URL: http://www.samtec.com/documents/webfiles/cpdf/SSW-1XX-XX-XXX-X-XX-XXX-XX-MKT.pdf
footprint SMTC-SSW-106-02-X-S-RA (SQ Post Socket, 1x6 Pins, Right Angle, 2.54mm Pitch, Female)
pins: 1, 2, 3, 4, 5, 6

## SSW-106-02-G-S
designator J?
SQ Post Socket, Through-hole, Vertical, -55 to 125 degC, 2.54mm Pitch, 6-Pin, Female, RoHS; Manufacturer: Samtec; PartNumber: SSW-106-02-G-S; DatasheetVersion: F-214; PackageVersion: CA, 6/1987; PackageReference: SSW-106-02-X-S; PackageDescription: Assembly, Socket Strip .016 X .031 Tail; Supplier 1: Digi-Key; Supplier Part Number 1: SAM1216-06-ND; Supplier 2: Farnell; Supplier Part Number 2: 1668356; Supplier 3: Newark; Supplier Part Number 3: 11P9412; Orientation: Vertical; Pitch: 2.54 mm; RoHS: True; Temperature Range: -55 to 125 degC; Mounting Technology: Through-hole; ComponentLink1Description: Manufacturer URL; ComponentLink1URL: http://www.samtec.com; ComponentLink2Description: Datasheet; ComponentLink2URL: http://www.samtec.com/documents/webfiles/pdf/SSW_TH.PDF; ComponentLink3Description: Package Specification; ComponentLink3URL: http://www.samtec.com/documents/webfiles/cpdf/SSW-1XX-XX-XXX-X-XX-XXX-XX-MKT.pdf
footprint SMTC-SSW-106-02-X-S (SQ Post Socket, 1x6 Pins, Vertical, 2.54mm Pitch, Female)
pins: 1, 2, 3, 4, 5, 6

## SSW-106-02-G-S-RA
designator J?
SQ Post Socket, Through-hole, Right Angle, -55 to 125 degC, 2.54mm Pitch, 6-Pin, Female, RoHS; Manufacturer: Samtec; PartNumber: SSW-106-02-G-S-RA; DatasheetVersion: F-214; PackageVersion: CA, 6/1987; PackageReference: SSW-106-02-X-S-RA; PackageDescription: Assembly, Socket Strip .016 X .031 Tail; Supplier 1: Digi-Key; Supplier Part Number 1: SAM1225-06-ND; Supplier 2: Farnell; Supplier Part Number 2: 1668357; Supplier 3: Newark; Supplier Part Number 3: 11P9413; Supplier 4: Newark; Supplier Part Number 4: 15P2891; Orientation: Right Angle; Pitch: 2.54 mm; RoHS: True; Temperature Range: -55 to 125 degC; Mounting Technology: Through-hole; ComponentLink1Description: Manufacturer URL; ComponentLink1URL: http://www.samtec.com; ComponentLink2Description: Datasheet; ComponentLink2URL: http://www.samtec.com/documents/webfiles/pdf/SSW_TH.PDF; ComponentLink3Description: Package Specification; ComponentLink3URL: http://www.samtec.com/documents/webfiles/cpdf/SSW-1XX-XX-XXX-X-XX-XXX-XX-MKT.pdf
footprint SMTC-SSW-106-02-X-S-RA (SQ Post Socket, 1x6 Pins, Right Angle, 2.54mm Pitch, Female)
pins: 1, 2, 3, 4, 5, 6

## SSW-106-02-L-S
designator J?
SQ Post Socket, Through-hole, Vertical, -55 to 125 degC, 2.54mm Pitch, 6-Pin, Female, RoHS; Manufacturer: Samtec; PartNumber: SSW-106-02-L-S; DatasheetVersion: F-214; PackageVersion: CA, 6/1987; PackageReference: SSW-106-02-X-S; PackageDescription: Assembly, Socket Strip .016 X .031 Tail; Orientation: Vertical; Pitch: 2.54 mm; RoHS: True; Temperature Range: -55 to 125 degC; Mounting Technology: Through-hole; ComponentLink1Description: Manufacturer URL; ComponentLink1URL: http://www.samtec.com; ComponentLink2Description: Datasheet; ComponentLink2URL: http://www.samtec.com/documents/webfiles/pdf/SSW_TH.PDF; ComponentLink3Description: Package Specification; ComponentLink3URL: http://www.samtec.com/documents/webfiles/cpdf/SSW-1XX-XX-XXX-X-XX-XXX-XX-MKT.pdf
footprint SMTC-SSW-106-02-X-S (SQ Post Socket, 1x6 Pins, Vertical, 2.54mm Pitch, Female)
pins: 1, 2, 3, 4, 5, 6

## SSW-106-02-L-S-RA
designator J?
SQ Post Socket, Through-hole, Right Angle, -55 to 125 degC, 2.54mm Pitch, 6-Pin, Female, RoHS; Manufacturer: Samtec; PartNumber: SSW-106-02-L-S-RA; DatasheetVersion: F-214; PackageVersion: CA, 6/1987; PackageReference: SSW-106-02-X-S-RA; PackageDescription: Assembly, Socket Strip .016 X .031 Tail; Orientation: Right Angle; Pitch: 2.54 mm; RoHS: True; Temperature Range: -55 to 125 degC; Mounting Technology: Through-hole; ComponentLink1Description: Manufacturer URL; ComponentLink1URL: http://www.samtec.com; ComponentLink2Description: Datasheet; ComponentLink2URL: http://www.samtec.com/documents/webfiles/pdf/SSW_TH.PDF; ComponentLink3Description: Package Specification; ComponentLink3URL: http://www.samtec.com/documents/webfiles/cpdf/SSW-1XX-XX-XXX-X-XX-XXX-XX-MKT.pdf
footprint SMTC-SSW-106-02-X-S-RA (SQ Post Socket, 1x6 Pins, Right Angle, 2.54mm Pitch, Female)
pins: 1, 2, 3, 4, 5, 6

## SSW-106-02-T-S
designator J?